# Altium footprint library MyLibrarySum.PcbLib: 208 footprints (part 13 of 13)
Each footprint in its own frame and in the unit in brackets; x right, y up, seen from the top. Pads: shape width x height; smd on the part's side, far side on the other; paste and mask are expansions set on the pad; w line width, h text height; cw(c..) or ccw(c..) is an arc to the next point about the centre after c.
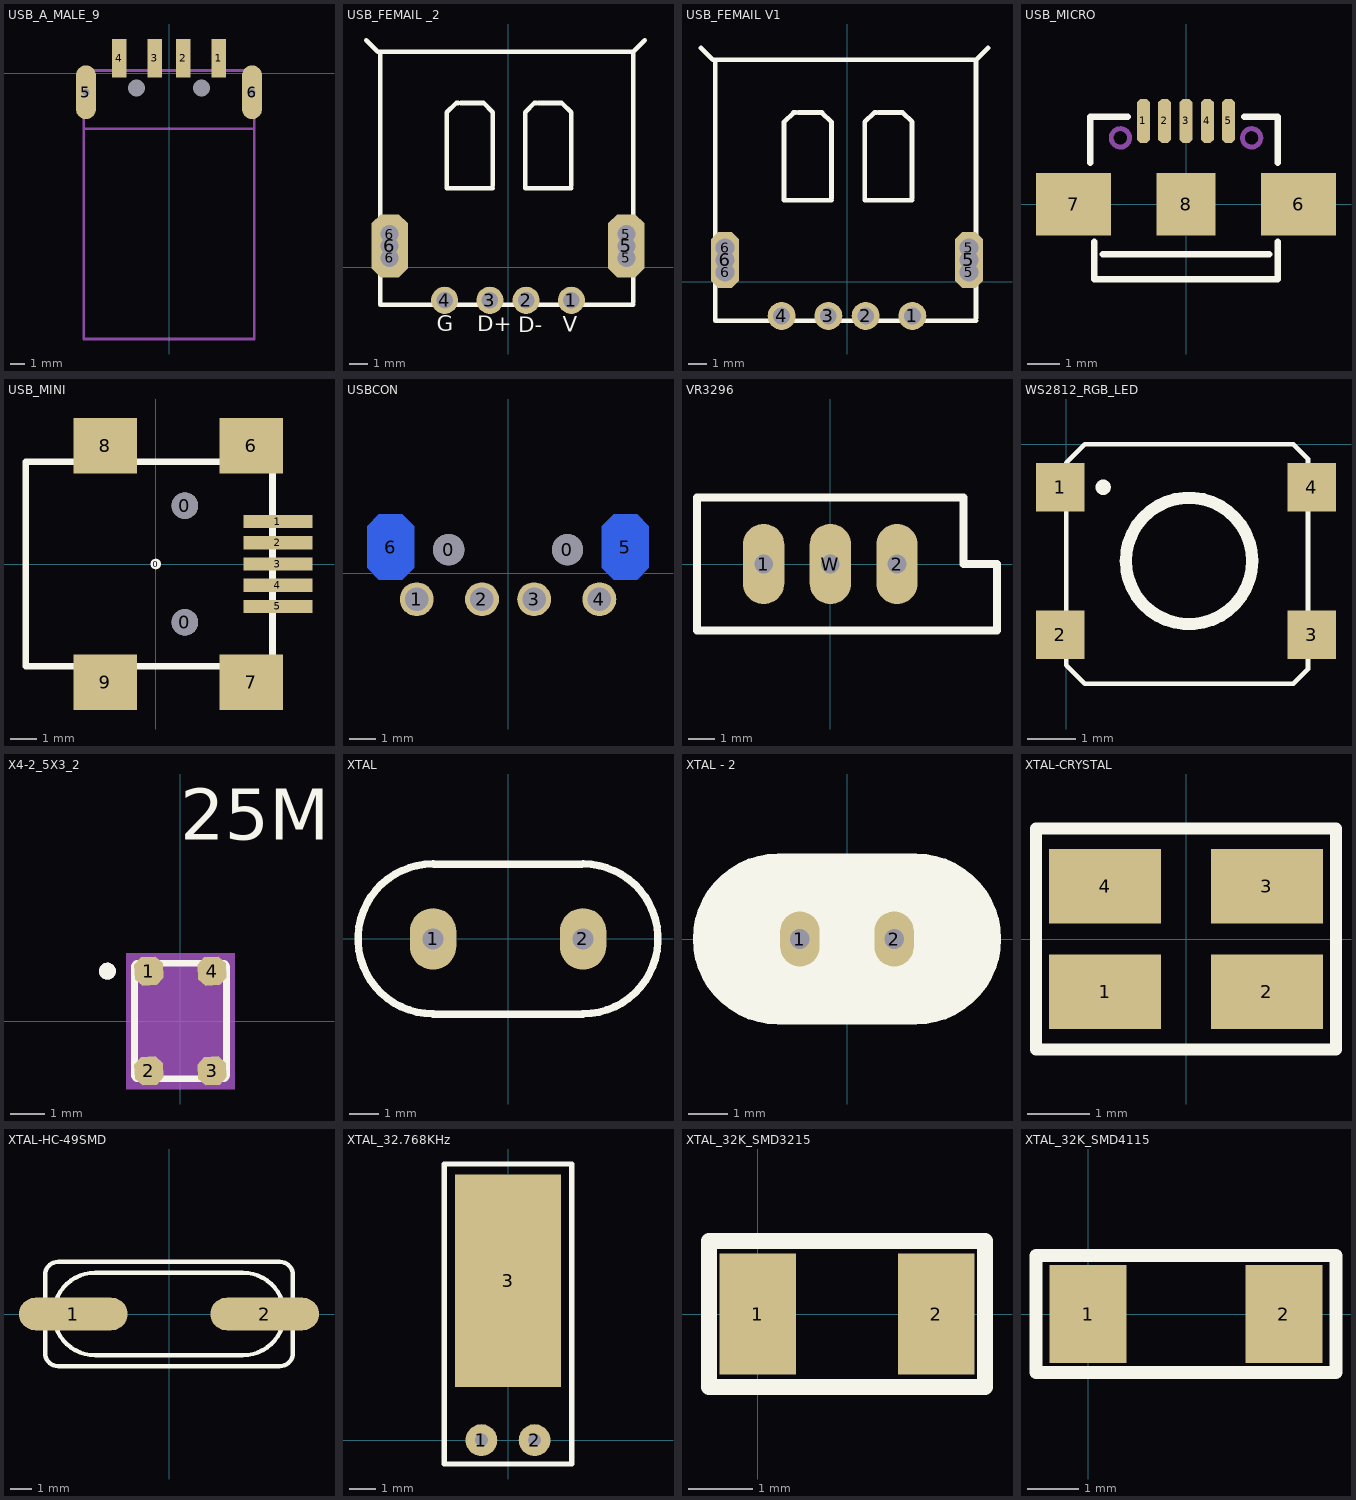
[diagram p12: the footprints below, top view; thin cyan lines are the x and y axes]

## USB_A_MALE_9 [mm]
height 1.524
pads (8):
  round 0 hole 1.2 unplated: 0(-2.3,-1.05) 0(2.3,-1.05)
  rect 1x2.7 smd: 1(3.5,1.05) 2(1,1.05) 3(-1,1.05) 4(-3.5,1.05)
  oval 1.4x3.8 hole 0.5: 5(-5.85,-1.35) 6(5.85,-1.35)
Mechanical 1:
  lines w0.2: -6,-3.919 6,-3.919 ; -6,-18.722 6,-18.722 6,0.178 -6,0.178 -6,-18.722
3D body: height 0.54, standoff -2.46, extent -4.019,-7.239 4.781,-1.639

## USB_FEMAIL _2 [mm]
pads (10):
  round 1.5 hole 0.9: 1(3.5,-1.829) 2(1,-1.829) 3(-1,-1.829) 4(-3.5,-1.829)
  round 1 hole 1: 5(6.533,0.508) 5(6.533,1.829) 6(-6.533,0.508) 6(-6.533,1.829)
  oct 2x3.5 hole 1: 5(6.533,1.171) 6(-6.533,1.171)
Top Overlay:
  lines w0.254: -7.818,12.522 -7.183,11.887 -7.056,11.887 ; -2.738,9.068 -2.865,9.068 -3.373,8.56 -3.373,4.369 -0.833,4.369 ; -2.611,9.068 -1.341,9.068 -0.833,8.56 -0.833,4.496 ; 1.58,9.068 1.453,9.068 0.945,8.56 0.945,4.369 3.485,4.369 ; 1.707,9.068 2.977,9.068 3.485,8.56 3.485,4.496 ; 6.914,-2.083 -7.056,-2.083 -7.056,11.887 ; 6.914,-1.956 6.914,11.887 ; 7.549,12.522 6.914,11.887 ; -7.056,11.887 6.914,11.887
  text "G" at -3.932,-3.835 h1.5
  text "D+" at -1.697,-3.835 h1.5
  text "D-" at 0.564,-3.886 h1.5
  text "V" at 3.028,-3.861 h1.5
3D body: height 7.55, standoff -3.3, extent -7.94,-2.871 7.86,11.289

## USB_FEMAIL V1 [mm]
height 2.54
pads (10):
  round 1.5 hole 0.9: 1(3.5,-1.829) 2(1,-1.829) 3(-1,-1.829) 4(-3.5,-1.829)
  round 1 hole 1: 5(6.533,0.508) 5(6.533,1.829) 6(-6.533,0.508) 6(-6.533,1.829)
  oct 1.5x3 hole 1: 5(6.533,1.171) 6(-6.533,1.171)
Top Overlay:
  lines w0.254: -7.818,12.522 -7.183,11.887 -7.056,11.887 ; -2.738,9.068 -2.865,9.068 -3.373,8.56 -3.373,4.369 -0.833,4.369 ; -2.611,9.068 -1.341,9.068 -0.833,8.56 -0.833,4.496 ; 1.58,9.068 1.453,9.068 0.945,8.56 0.945,4.369 3.485,4.369 ; 1.707,9.068 2.977,9.068 3.485,8.56 3.485,4.496 ; 6.914,-2.083 -7.056,-2.083 -7.056,11.887 ; 6.914,-1.956 6.914,11.887 ; 7.549,12.522 6.914,11.887 ; -7.056,11.887 6.914,11.887
3D body: height 6.95, standoff -4.2, extent -7.874,-2.651 7.926,11.049

## USB_MICRO [mm] "USB方孔"
height 8
pads (8):
  oct 0.4x1.35 smd: 1(-1.3,2.54) 2(-0.65,2.54) 3(0,2.54) 4(0.65,2.54) 5(1.3,2.54)
  rect 2.286x1.9 smd: 6(3.429,0) 7(-3.429,0)
  rect 1.8x1.9 smd: 8(0,0)
Top Overlay:
  lines w0.2: -2.921,1.27 -2.921,2.667 -1.778,2.667 ; -2.794,-1.143 -2.794,-2.286 2.794,-2.286 2.794,-1.143 ; -2.54,-1.524 2.54,-1.524 ; 1.778,2.667 2.794,2.667 2.794,1.27
Mechanical 1:
  circle w0.15: c-2,2.023 r0.28
  circle w0.15: c2,2.023 r0.28

## USB_MINI [mm]
pads (12):
  round 0.4 on Top Overlay: 0(0,0)
  round 1 hole 1: 0(1.1,-2.2) 0(1.1,2.2)
  rect 2.6x0.5 smd: 1(4.6,1.6) 2(4.6,0.8) 3(4.6,0) 4(4.6,-0.8) 5(4.6,-1.6)
  rect 2.4x2.1 smd: 6(3.6,4.45) 7(3.6,-4.45) 8(-1.9,4.45) 9(-1.9,-4.45)
Top Overlay:
  lines w0.254: -4.9,-3.85 -4.9,3.85 4.4,3.85 4.4,-3.85 -4.9,-3.85
3D body: height 2.14, standoff -2.95, extent -4.064,-4.696 5.136,5.204

## USBCON [mm]
pads (8):
  round 1.2 hole 1.2 unplated: 0(-2.273,0.9) 0(2.277,0.9)
  round 1.3 hole 0.9: 1(-3.498,-1) 2(-0.998,-1) 3(1.002,-1) 4(3.502,-1)
  oct 1.8x2.5 smd far side: 5(4.498,1) 6(-4.498,1)
Bottom Overlay:
  lines w0.254: -5.498,-3 -5.498,3.7 -1.998,3.7 -0.998,2.7 1.002,2.7 2.002,3.7 5.502,3.7 5.502,-3 -5.498,-3
3D body: height 4.5, standoff -1.3, extent -6.35,-1.326 6.256,18.598

## VR3296 [mil]
pads (3):
  oval 62x120 hole 28: 1(-100,0) 2(100,0) W(0,0)
Top Overlay:
  lines w12: -200,-100 -200,100 200,100 200,0 250,0 250,-100 -200,-100

## WS2812_RGB_LED [mm]
pads (5):
  rect 1x1 smd: 1(-0.127,-0.889) 2(-0.127,-3.937) 3(5.08,-3.937) 4(5.08,-0.889)
  round 0.324 on Top Overlay: ""(0.762,-0.889)
Top Overlay:
  circle w0.254: c2.54,-2.413 r1.308
  lines w0.1: 0,-4.572 0.381,-4.953 4.699,-4.953 5,-4.652 5,-0.301 4.699,0 0.381,0 0,-0.381 0,-4.572

## X4-2_5X3_2 [mm] "X4-2_5X3_2"
pads (4):
  oct 0.846x0.846 smd rot 93: 1(-0.928,1.465) 2(-0.928,-1.465) 3(0.928,-1.465) 4(0.928,1.465)
Top Overlay:
  circle w0.25: c-2.15,1.465 r0.125
  lines w0.2: -1.35,-1.6 ccw(c-1.25,-1.6) -1.25,-1.7 1.25,-1.7 ccw(c1.25,-1.6) 1.35,-1.6 1.35,1.6 ccw(c1.25,1.6) 1.25,1.7 -1.25,1.7 ccw(c-1.25,1.6) -1.35,1.6 -1.35,-1.6
  text "25MHZ" at 0,5.325 h1.5
Mechanical 11:
  text "4" at 0.928,1.425 h0.4
  text "2" at -0.928,-1.505 h0.4
  text "3" at 0.928,-1.505 h0.4
  text "1" at -0.928,1.425 h0.4
Mechanical 12:
  circle w0.25: c-2.15,1.465 r0.125
  lines w0.2: -1.35,-1.6 ccw(c-1.25,-1.6) -1.25,-1.7 1.25,-1.7 ccw(c1.25,-1.6) 1.35,-1.6 1.35,1.6 ccw(c1.25,1.6) 1.25,1.7 -1.25,1.7 ccw(c-1.25,1.6) -1.35,1.6 -1.35,-1.6
  text ".Designator" at 0,0.12 h0.4
  text "25MHZ" at 0,0.6 h0.4
  text "RichardLC" at 0,1.24 h0.4
  text "pn" at 0,0.12 h0.4
Mechanical 13:
  region: -1.6,2 -1.6,-2 1.6,-2 1.6,2
Mechanical 16:
  pour cut-out: -1.35,-1.7 1.35,-1.7 1.35,1.7 -1.35,1.7

## XTAL [mil]
pads (2):
  oval 62x82 hole 28: 1(-100,0) 2(100,0)
Top Overlay:
  lines w10: -100,-100.39 99.8,-100.39 ; -100,-100 cw(c-100,0) -100,100 ; -99.02,99.41 98.62,99.37 ; 100,-100 ccw(c100,0) 100,100
3D body: height 121.8, standoff -100, extent -210,-55 210,65

## XTAL - 2 [mm] "10*4.5----5"
pads (2):
  oval 1x1.4 hole 0.5: 1(-1.2,0) 2(1.2,0)
Top Overlay:
  region: -1.76,2.06 -2.162,2.02 -2.548,1.903 -2.904,1.713 -3.217,1.457 -3.473,1.144 -3.663,0.788 -3.78,0.402 -3.82,0 -3.78,-0.402 -3.663,-0.788 -3.473,-1.144 -3.217,-1.457 -2.904,-1.713 -2.548,-1.903 -2.162,-2.02 -1.76,-2.06 -1.76,-2.05 1.76,-2.06 2.162,-2.02 2.548,-1.903 2.904,-1.713 3.217,-1.457 3.473,-1.144 3.663,-0.788 3.78,-0.402 3.82,0 3.78,0.402 3.663,0.788 3.473,1.144 3.217,1.457 2.904,1.713 2.548,1.903 2.162,2.02 1.76,2.06 1.76,2.05
  lines w0.254: -1.75,-2.05 cw(c-1.75,0) -1.75,2.05 1.75,2.05 cw(c1.75,0) 1.75,-2.05 -1.75,-2.05
3D body: height 1.8, standoff 0, extent -3.81,-2.06 3.81,2.06

## XTAL-CRYSTAL [mm]
pads (4):
  rect 1.8x1.2 smd: 1(-1.3,-0.85) 2(1.3,-0.85) 3(1.3,0.85) 4(-1.3,0.85)
Top Overlay:
  lines w0.2: -2.413,-1.778 -2.413,1.778 2.413,1.778 2.413,-1.778 -2.413,-1.778
3D body: height 0.7, standoff 0, extent -1.605,-1.272 1.605,1.238

## XTAL-HC-49SMD [mm]
height 3.8
pads (2):
  oval 5x1.5 smd: 1(-4.4,0) 2(4.4,0)
Top Overlay:
  lines w0.2: -5.7,-1.8 ccw(c-5.1,-1.8) -5.1,-2.4 5.1,-2.4 ccw(c5.1,-1.8) 5.7,-1.8 5.7,1.8 ccw(c5.1,1.8) 5.1,2.4 -5.1,2.4 ccw(c-5.1,1.8) -5.7,1.8 -5.7,-1.8 ; -3.4,-1.9 cw(c-3.4,0) -3.4,1.9 3.4,1.9 cw(c3.4,0) 3.4,-1.9 -3.4,-1.9
3D body: height 4.3, standoff 0, extent -6.4,-2.415 6.4,2.415

## XTAL_32.768KHz [mm]
pads (3):
  round 1.2 hole 0.5: 1(-1,0) 2(1,0)
  rect 4x8 smd: 3(0,6)
Top Overlay:
  lines w0.2: -2.4,-0.9 -2.4,10.4 2.4,10.4 2.4,-0.9 -2.4,-0.9
3D body: height 1.95, standoff -2, extent -1.15,-0.15 1.15,8.2

## XTAL_32K_SMD3215 [mm]
pads (2):
  rect 1.2x1.9 smd: 1(0,0) 2(2.794,0)
Top Overlay:
  lines w0.254: -0.762,-1.143 3.556,-1.143 3.556,1.143 -0.762,1.143 -0.762,-1.143

## XTAL_32K_SMD4115 [mm]
pads (2):
  rect 1.5x1.9 smd: 1(0,0) 2(3.81,0)
Top Overlay:
  lines w0.254: -1.016,-1.143 -1.016,1.143 4.826,1.143 4.826,-1.143 -1.016,-1.143